# Altium footprint library Mine.PcbLib: 306 footprints (part 5 of 20)
Each footprint in its own frame and in the unit in brackets; x right, y up, seen from the top. Pads: shape width x height; smd on the part's side, far side on the other; paste and mask are expansions set on the pad; w line width, h text height; cw(c..) or ccw(c..) is an arc to the next point about the centre after c.
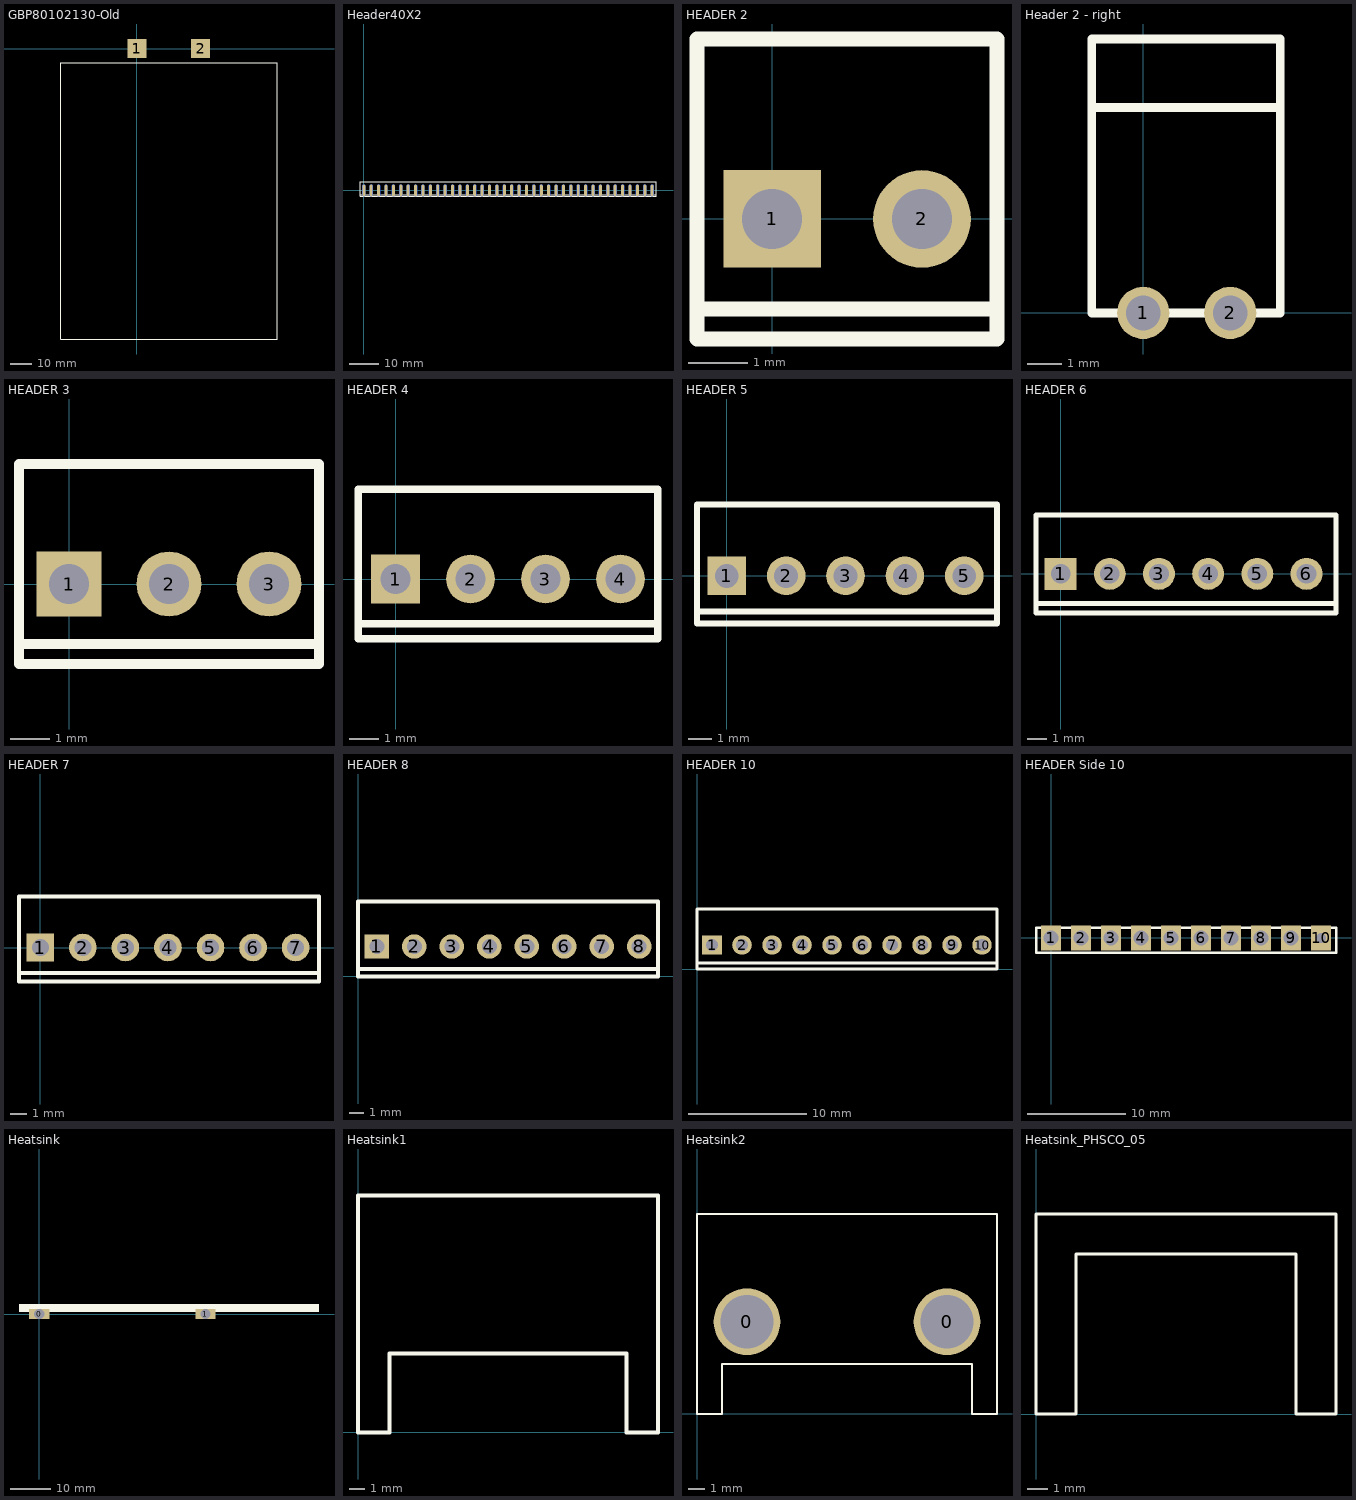
[diagram p4: the footprints below, top view; thin cyan lines are the x and y axes]

## GBP80102130-Old [mm]
height 7
pads (2):
  rect 9x9 smd: 1(0,0) 2(30,0)
Top Overlay:
  lines w0.127: -35.814,-136.731 66.059,-136.731 66.059,-6.731 -35.814,-6.731 -35.814,-136.731

## Header40X2 [mil]
height 39.37
pads (80):
  oval 40x157.48 smd: 1(0,0) 2(100,0) 3(200,0) 4(300,0) 5(400,0) 6(500,0) 7(600,0) 8(700,0) 9(800,0) 10(900,0) 11(1000,0) 12(1100,0) 13(1200,0) 14(1300,0) 15(1400,0) 16(1500,0) 17(1600,0) 18(1700,0) 19(1800,0) 20(1900,0) 21(2000,0) 22(2100,0) 23(2200,0) 24(2300,0) 25(2400,0) 26(2500,0) 27(2600,0) 28(2700,0) 29(2800,0) 30(2900,0) 31(3000,0) 32(3100,0) 33(3200,0) 34(3300,0) 35(3400,0) 36(3500,0) 37(3600,0) 38(3700,0) 39(3800,0) 40(3900,0)
  oval 40x157.48 smd far side: 41(0,0) 42(100,0) 43(200,0) 44(300,0) 45(400,0) 46(500,0) 47(600,0) 48(700,0) 49(800,0) 50(900,0) 51(1000,0) 52(1100,0) 53(1200,0) 54(1300,0) 55(1400,0) 56(1500,0) 57(1600,0) 58(1700,0) 59(1800,0) 60(1900,0) 61(2000,0) 62(2100,0) 63(2200,0) 64(2300,0) 65(2400,0) 66(2500,0) 67(2600,0) 68(2700,0) 69(2800,0) 70(2900,0) 71(3000,0) 72(3100,0) 73(3200,0) 74(3300,0) 75(3400,0) 76(3500,0) 77(3600,0) 78(3700,0) 79(3800,0) 80(3900,0)
Top Overlay:
  lines w10: -50,-60 3955,-60 ; -50,-80 3955,-80 3955,120 -50,120 -50,-80

## HEADER 2 [mil]
pads (2):
  rect 65x65 hole 40: 1(0,0)
  round 65 hole 40: 2(100,0)
Top Overlay:
  lines w10: -50,-60 150,-60 ; -50,-80 -50,120 150,120 150,-80 -50,-80

## Header 2 - right [mil]
height 98.43
pads (2):
  round 60 hole 40: 1(0,0) 2(100,0)
Top Overlay:
  lines w10: -59.06,236.22 157.48,236.22 ; -59.06,0 157.48,0 157.48,314.96 -59.06,314.96 -59.06,0

## HEADER 3 [mil]
pads (3):
  rect 65x65 hole 40: 1(0,0)
  round 65 hole 40: 2(100,0) 3(200,0)
Top Overlay:
  lines w10: -50,-60 250,-60 ; -50,-80 250,-80 250,120 -50,120 -50,-80

## HEADER 4 [mil]
pads (4):
  rect 65x65 hole 40: 1(0,0)
  round 65 hole 40: 2(100,0) 3(200,0) 4(300,0)
Top Overlay:
  lines w10: -50,-60 350,-60 ; -50,-80 -50,120 350,120 350,-80 -50,-80

## HEADER 5 [mil]
pads (5):
  rect 65x65 hole 40: 1(0,0)
  round 65 hole 40: 2(100,0) 3(200,0) 4(300,0) 5(400,0)
Top Overlay:
  lines w10: -50,-60 455,-60 ; -50,-80 -50,120 455,120 455,-80 -50,-80

## HEADER 6 [mil]
pads (6):
  rect 65x65 hole 40: 1(0,0)
  round 65 hole 40: 2(100,0) 3(200,0) 4(300,0) 5(400,0) 6(500,0)
Top Overlay:
  lines w10: -50,-60 560,-60 ; -50,-80 -50,120 560,120 560,-80 -50,-80

## HEADER 7 [mil]
pads (7):
  rect 65x65 hole 40: 1(0,0)
  round 65 hole 40: 2(100,0) 3(200,0) 4(300,0) 5(400,0) 6(500,0) 7(600,0)
Top Overlay:
  lines w10: -50,-60 650,-60 ; -50,-80 655,-80 655,120 -50,120 -50,-80

## HEADER 8 [mil]
pads (8):
  rect 65x65 hole 40: 1(50,80)
  round 65 hole 40: 2(150,80) 3(250,80) 4(350,80) 5(450,80) 6(550,80) 7(650,80) 8(750,80)
Top Overlay:
  lines w10: 0,20 800,20 ; 0,0 0,200 800,200 800,0 0,0

## HEADER 10 [mil]
pads (10):
  rect 65x65 hole 40: 1(50,80)
  round 65 hole 40: 2(150,80) 3(250,80) 4(350,80) 5(450,80) 6(550,80) 7(650,80) 8(750,80) 9(850,80) 10(950,80)
Top Overlay:
  lines w10: 0,20 1000,20 ; 0,0 0,200 1000,200 1000,0 0,0

## HEADER Side 10 [mil]
pads (10):
  rect 80x100 hole 60: 1(0,0) 2(120,0) 3(240,0) 4(360,0) 5(480,0) 6(600,0) 7(720,0) 8(840,0) 9(960,0)
  rect 80x100 hole 40: 10(1080,0)
Top Overlay:
  lines w10: -60,-60 1140,-60 1140,40 -60,40 -60,-60

## Heatsink [mil]
pads (2):
  rect 200x100 hole 100: 0(0,0) 1(1640,0)
Top Overlay:
  rectangle: -200,20 2760,100

## Heatsink1 [mil]
height 984.25
Top Overlay:
  lines w10: 0,0 0,590.55 748.03,590.55 748.03,0 669.29,0 669.29,196.85 78.74,196.85 78.74,0 0,0

## Heatsink2 [mm]
height 23
pads (2):
  round 4 hole 3.2: 0(3,5.537) 0(15,5.537)
Top Overlay:
  lines w0.127: 0,0 0,12 18,12 18,0 16.5,0 16.5,3 1.5,3 1.5,0 0,0

## Heatsink_PHSCO_05 [mil]
height 905.51
Top Overlay:
  lines w5: 0,0 78.74,0 78.74,314.96 511.81,314.96 511.81,0 590.55,0 590.55,393.7 0,393.7 0,0